# Altium footprint library PcbLib1.PcbLib: 170 footprints (part 7 of 11)
Each footprint in its own frame and in the unit in brackets; x right, y up, seen from the top. Pads: shape width x height; smd on the part's side, far side on the other; paste and mask are expansions set on the pad; w line width, h text height; cw(c..) or ccw(c..) is an arc to the next point about the centre after c.
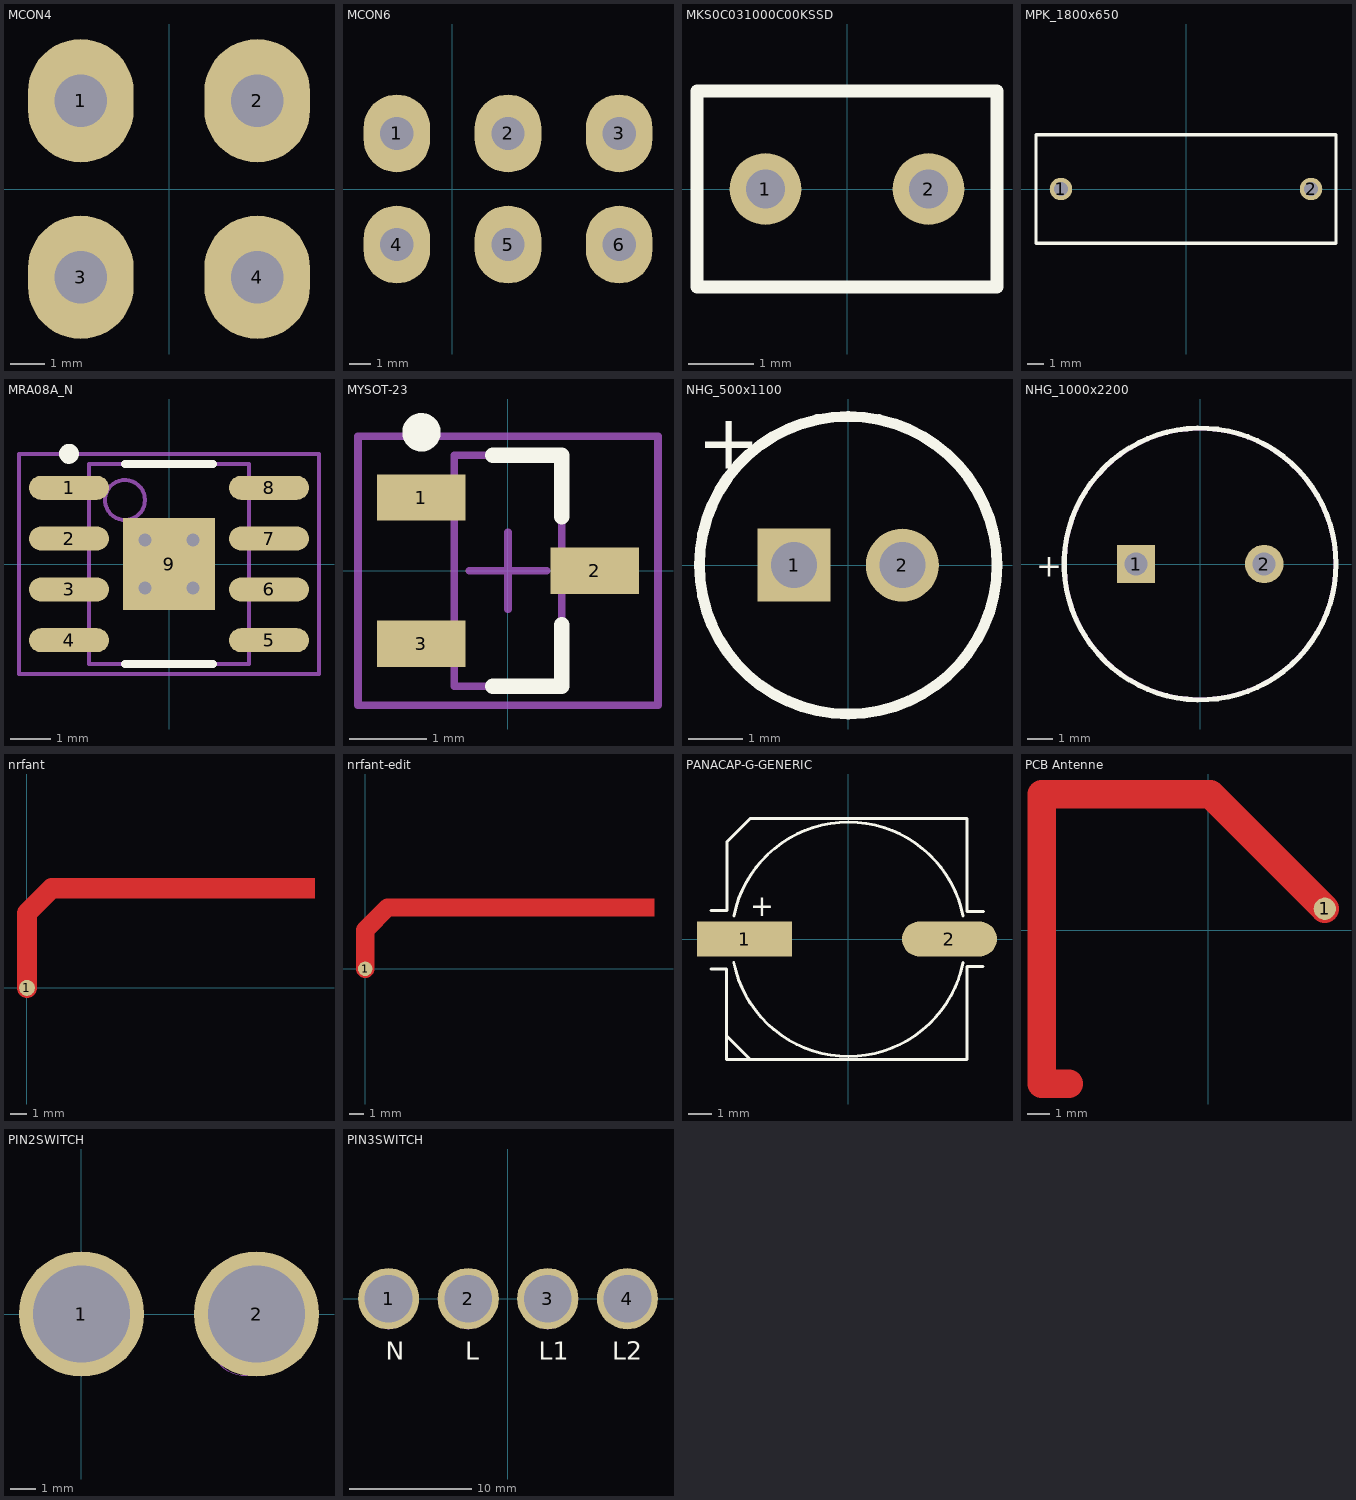
[diagram p6: the footprints below, top view; thin cyan lines are the x and y axes]

## MCON4 [mil]
pads (4):
  oval 120x140 hole 60: 1(-100,100) 2(100,100) 3(-100,-100) 4(100,-100)

## MCON6 [mil]
pads (6):
  oval 120x140 hole 60: 1(-100,100) 2(100,100) 3(300,100) 4(-100,-100) 5(100,-100) 6(300,-100)

## MKS0C031000C00KSSD [mm]
pads (2):
  round 1.1 hole 0.6: 1(-1.25,0) 2(1.25,0)
Top Overlay:
  lines w0.1: -2.3,-1.5 -2.3,1.5 2.3,1.5 2.3,-1.5 -2.3,-1.5
  lines w0.2: -2.3,-1.5 -2.3,1.5 2.3,1.5 2.3,-1.5 -2.3,-1.5
3D body: height 7.25, standoff -2.25, extent -2.3,-1.25 2.3,1.25

## MPK_1800x650 [mm] "TH, 2-Leads, Body 18x6.5mm, Lead Spacing 15mm"
height 12
pads (2):
  round 1.35 hole 0.85: 1(-7.5,0) 2(7.5,0)
Top Overlay:
  lines w0.2: -9,-3.25 9,-3.25 9,3.25 -9,3.25 -9,-3.25
Mechanical 5:
  lines w0.1: -9,-3.25 -9,3.25 9,3.25 9,-3.25 -9,-3.25
3D body: height 12, standoff 1, extent -9,-3.25 9,3.25
3D body: height 0, standoff -2.5, extent -7.797,-0.299 -7.2,0.3
3D body: height 0, standoff -2.5, extent 7.202,-0.299 7.8,0.3
3D body: height 1.9, standoff -0.1, extent -8.49,-0.996 -6.5,0.996
3D body: height 1.9, standoff -0.1, extent 6.5,-0.996 8.49,0.996

## MRA08A_N [mm] "SOIC, 8-Leads, Body 4.9x3.9mm, Pitch 1.27mm, Exposed Pad, IPC Medium Density"
height 1.68
pads (9):
  oval 2x0.6 smd: 1(-2.5,1.905) 2(-2.5,0.635) 3(-2.5,-0.635) 4(-2.5,-1.905) 5(2.5,-1.905) 6(2.5,-0.635) 7(2.5,0.635) 8(2.5,1.905)
  rect 2.29x2.29 smd: 9(0,0)
via -0.6,0.6 diameter 0.66 hole 0.33
via 0.6,0.6 diameter 0.66 hole 0.33
via 0.6,-0.6 diameter 0.66 hole 0.33
via -0.6,-0.6 diameter 0.66 hole 0.33
Top Overlay:
  circle w0.25: c-2.5,2.755 r0.125
  lines w0.2: -1.1,-2.5 1.1,-2.5 ; -1.1,2.5 1.1,2.5
Mechanical 13:
  circle w0.1: c-1.1,1.6 r0.5
  lines w0.1: -2,-2.5 -2,2.5 2,2.5 2,-2.5 -2,-2.5
Mechanical 15:
  lines w0.1: -0.5,0 0.5,0 ; 0,-0.5 0,0.5 ; -3.75,-2.75 -3.75,2.75 3.75,2.75 3.75,-2.75 -3.75,-2.75
3D body: height 1.68, standoff 0.03, extent -2,-2.5 2,2.5

## MYSOT-23 [mm] "SOT23, 3-Leads, Body 2.9x1.3mm, Pitch 0.95mm, Lead Span 2.4mm, IPC Medium Density"
height 1.14
pads (3):
  rect 1.15x0.6 smd: 1(-1.125,0.95) 2(1.125,0) 3(-1.125,-0.95)
Top Overlay:
  circle w0.25: c-1.125,1.8 r0.125
  lines w0.2: -0.2,-1.5 0.7,-1.5 0.7,-0.7 ; -0.2,1.5 0.7,1.5 0.7,0.7
Mechanical 13:
  lines w0.1: -0.7,-1.5 -0.7,1.5 0.7,1.5 0.7,-1.5 -0.7,-1.5
Mechanical 15:
  lines w0.1: -0.5,0 0.5,0 ; 0,-0.5 0,0.5 ; -1.95,-1.75 -1.95,1.75 1.95,1.75 1.95,-1.75 -1.95,-1.75
3D body: height 1.14, standoff 0, extent -0.7,-1.5 0.7,1.5

## NHG_500x1100 [mm] "TH, 2-Leads, Dia 5mm,  Lead Spacing 2mm"
height 12
pads (2):
  rect 1.35x1.35 hole 0.85: 1(-1,0)
  round 1.35 hole 0.85: 2(1,0)
Top Overlay:
  circle w0.2: c0,0 r2.75
  text "+" at -2.794,1.778 h1.02
Mechanical 5:
  circle w0.1: c0,0 r2.75
  text "+" at -3.8,-0.4 h1.02
3D body: height 12.51, standoff -3, extent -2.728,-2.745 2.75,2.746

## NHG_1000x2200 [mm] "Panasonic"
height 24
pads (2):
  rect 1.5x1.5 hole 0.9: 1(-2.5,0)
  round 1.5 hole 0.9: 2(2.5,0)
Top Overlay:
  circle w0.2: c0,0 r5.3
  text "+" at -6.4,-0.5 h0.89
Mechanical 5:
  circle w0.1: c0,0 r5.25
  text "+" at -6.4,-0.5 h0.89
3D body: height 24.01, standoff -4, extent -5.209,-5.241 5.24,5.242

## nrfant [mm]
pads (1):
  round 1 smd: 1(0,0)
Top Layer:
  region: 18.048,5.617 18.048,6.887 17.286,6.887 17.286,5.617
  lines w1.27: 0,0 0,4.689 ; 17.401,6.248 1.559,6.248 ; 0,4.689 1.559,6.248 ; 0,4.689 0,4.689 ; 1.559,6.248 1.559,6.248

## nrfant-edit [mm]
pads (1):
  round 1 smd: 1(0,0)
Top Layer:
  region: 20.048,3.617 20.048,4.887 19.286,4.887 19.286,3.617
  lines w1.27: 0,0 0,2.689 1.559,4.248 ; 1.558,4.248 19.401,4.248

## PANACAP-G-GENERIC [mil]
pads (2):
  rect 160x59.06 smd: 1(-175,0)
  oval 160x59.06 smd: 2(170,0)
Top Overlay:
  lines w5: -231.3,-50.2 -205.71,-50.2 ; -231.3,48.23 -205.71,48.23 ; -205.71,-163.39 -205.71,-50.2 ; -205.71,-104.33 -205.71,-50.2 ; -204.72,-163.39 -165.35,-202.76 ; -204.72,48.23 -204.72,163.39 -165.35,202.76 199.8,202.76 199.8,46.26 227.36,46.26 ; -193.14,-39.37 ccw(c-0.11,-0.76) 192.91,-39.37 ; -193.03,38.61 cw(c0,0) 193.03,38.61 ; 226.38,-46.26 199.8,-46.26 ; -205.71,-202.76 199.8,-202.76 199.8,-46.26 ; -205.71,-202.76 -205.71,-202.76 ; -205.71,-202.76 -205.71,-50.2 ; -205.71,-129.92 -205.71,-129.92 ; -205.71,-129.92 -205.71,-50.2 ; 199.8,-46.26 199.8,-46.26
  text "+" at -165.35,38.39 h35
3D body: height 401.57, standoff 0, extent -233.35,-202.75 223.34,202.76

## PCB Antenne [mm]
height 4
pads (1):
  round 1 smd: 1(5.225,0.971)
Top Layer:
  lines w0.762: -7.731,-6.825 -7.477,-6.851 ; 5.2,0.907 5.2,0.945
  lines w1.27: -7.477,-6.876 -6.251,-6.876 ; -7.477,-6.851 -7.477,6.103 0.092,6.103 ; 5.225,0.971 0.092,6.103 ; 0.092,6.103 0.093,6.103

## PCBComponent_1 - duplicate [mm]

## PCBComponent_1 - duplicate1 [mm]

## PIN2SWITCH [mm]
pads (2):
  round 5 hole 3.9: 1(0,0) 2(7,0)
Mechanical 1:
  lines w0.013: -1.005,-1.663 ccw(c-0.005,-0.048) 0.995,-1.663 ; -1.005,-1.663 -1.005,1.568 ; -1.005,-1.663 -0.991,-1.655 -0.977,-1.648 -0.963,-1.639 -0.948,-1.631 -0.933,-1.623 -0.918,-1.614 -0.905,-1.606 ; -1.005,1.568 cw(c-0.005,-0.048) 0.995,1.568 ; -1.005,1.568 -0.991,1.56 -0.977,1.552 -0.963,1.544 -0.948,1.536 -0.933,1.528 -0.918,1.519 -0.905,1.511 ; -0.905,-1.606 ccw(c-0.005,-0.048) 0.895,-1.606 ; -0.905,-1.606 -0.905,1.511 ; -0.905,1.511 cw(c-0.005,-0.048) 0.895,1.511 ; 0.895,-1.606 0.895,1.511 ; 0.895,-1.606 0.899,-1.609 0.914,-1.617 0.928,-1.625 0.942,-1.633 0.955,-1.641 0.969,-1.648 0.982,-1.656 0.995,-1.663 ; 0.895,1.511 0.91,1.52 0.924,1.528 0.938,1.536 0.952,1.544 0.966,1.551 0.979,1.559 0.992,1.566 0.995,1.568 ; 0.995,-1.663 0.995,1.568 ; 5.495,-1.663 ccw(c6.495,-0.048) 7.495,-1.663 ; 5.495,-1.663 5.495,1.568 ; 5.495,-1.663 5.506,-1.657 5.518,-1.651 5.529,-1.644 5.541,-1.638 5.552,-1.631 5.564,-1.624 5.576,-1.617 5.588,-1.61 5.595,-1.606 ; 5.495,1.568 cw(c6.495,-0.048) 7.495,1.568 ; 5.495,1.568 5.506,1.562 5.518,1.555 5.529,1.549 5.541,1.542 5.552,1.536 5.564,1.529 5.576,1.522 5.588,1.515 5.595,1.511 ; 5.595,-1.606 ccw(c6.495,-0.048) 7.395,-1.606 ; 5.595,-1.606 5.595,1.511 ; 5.595,1.511 cw(c6.495,-0.048) 7.395,1.511 ; 7.395,-1.606 7.395,1.511 ; 7.395,-1.606 7.402,-1.61 7.414,-1.617 7.426,-1.624 7.438,-1.631 7.45,-1.638 7.461,-1.644 7.473,-1.651 7.484,-1.657 7.495,-1.663 ; 7.395,1.511 7.408,1.518 7.42,1.525 7.432,1.532 7.444,1.539 7.455,1.546 7.467,1.552 7.478,1.559 7.49,1.565 7.495,1.568 ; 7.495,-1.663 7.495,1.568 ; -1.305,-1.148 ccw(c-0.005,-1.148) 1.295,-1.148 1.295,1.052 ccw(c-0.005,1.052) -1.305,1.052 -1.305,-1.148 ; 5.195,-1.148 ccw(c6.495,-1.148) 7.795,-1.148 7.795,1.052 ccw(c6.495,1.052) 5.195,1.052 5.195,-1.148

## PIN3SWITCH [mm]
pads (4):
  round 5 hole 3.9: 1(-9.75,0) 2(-3.25,0) 3(3.25,0) 4(9.75,0)
Top Overlay:
  text "L2" at 8.5,-5 h1.5
  text "L1" at 2.5,-5 h1.5
  text "L" at -3.5,-5 h1.5
  text "N" at -10,-5 h1.5
Mechanical 1:
  lines w0.013: -10.755,-1.663 ccw(c-9.755,-0.048) -8.755,-1.663 ; -10.755,-1.663 -10.755,1.568 ; -10.755,-1.663 -10.741,-1.655 -10.727,-1.648 -10.713,-1.639 -10.698,-1.631 -10.683,-1.623 -10.668,-1.614 -10.655,-1.606 ; -10.755,1.568 cw(c-9.755,-0.048) -8.755,1.568 ; -10.755,1.568 -10.741,1.56 -10.727,1.552 -10.713,1.544 -10.698,1.536 -10.683,1.528 -10.668,1.519 -10.655,1.511 ; -10.655,-1.606 ccw(c-9.755,-0.048) -8.855,-1.606 ; -10.655,-1.606 -10.655,1.511 ; -10.655,1.511 cw(c-9.755,-0.048) -8.855,1.511 ; -8.855,-1.606 -8.855,1.511 ; -8.855,-1.606 -8.851,-1.609 -8.836,-1.617 -8.822,-1.625 -8.808,-1.633 -8.795,-1.641 -8.781,-1.648 -8.768,-1.656 -8.755,-1.663 ; -8.855,1.511 -8.84,1.52 -8.826,1.528 -8.812,1.536 -8.798,1.544 -8.784,1.551 -8.771,1.559 -8.758,1.566 -8.755,1.568 ; -8.755,-1.663 -8.755,1.568 ; -4.255,-1.663 ccw(c-3.255,-0.048) -2.255,-1.663 ; -4.255,-1.663 -4.255,1.568 ; -4.255,-1.663 -4.244,-1.657 -4.232,-1.651 -4.221,-1.644 -4.209,-1.638 -4.198,-1.631 -4.186,-1.624 -4.174,-1.617 -4.162,-1.61 -4.155,-1.606 ; -4.255,1.568 cw(c-3.255,-0.048) -2.255,1.568 ; -4.255,1.568 -4.244,1.562 -4.232,1.555 -4.221,1.549 -4.209,1.542 -4.198,1.536 -4.186,1.529 -4.174,1.522 -4.162,1.515 -4.155,1.511 ; -4.155,-1.606 ccw(c-3.255,-0.048) -2.355,-1.606 ; -4.155,-1.606 -4.155,1.511 ; -4.155,1.511 cw(c-3.255,-0.048) -2.355,1.511 ; -2.355,-1.606 -2.355,1.511 ; -2.355,-1.606 -2.348,-1.61 -2.336,-1.617 -2.324,-1.624 -2.312,-1.631 -2.3,-1.638 -2.289,-1.644 -2.277,-1.651 -2.266,-1.657 -2.255,-1.663 ; -2.355,1.511 -2.342,1.518 -2.33,1.525 -2.318,1.532 -2.306,1.539 -2.295,1.546 -2.283,1.552 -2.272,1.559 -2.26,1.565 -2.255,1.568 ; -2.255,-1.663 -2.255,1.568 ; 2.245,-1.663 ccw(c3.245,-0.048) 4.245,-1.663 ; 2.245,-1.663 2.245,1.568 ; 2.245,-1.663 2.259,-1.655 2.273,-1.648 2.287,-1.639 2.302,-1.631 2.317,-1.623 2.332,-1.614 2.345,-1.606 ; 2.245,1.568 cw(c3.245,-0.048) 4.245,1.568 ; 2.245,1.568 2.259,1.56 2.273,1.552 2.287,1.544 2.302,1.536 2.317,1.528 2.332,1.519 2.345,1.511 ; 2.345,-1.606 ccw(c3.245,-0.048) 4.145,-1.606 ; 2.345,-1.606 2.345,1.511 ; 2.345,1.511 cw(c3.245,-0.048) 4.145,1.511 ; 4.145,-1.606 4.145,1.511 ; 4.145,-1.606 4.159,-1.614 4.174,-1.623 4.188,-1.631 4.203,-1.639 4.217,-1.648 4.231,-1.655 4.245,-1.663 ; 4.145,1.511 4.16,1.52 4.174,1.528 4.188,1.536 4.202,1.544 4.216,1.551 4.229,1.559 4.242,1.566 4.245,1.568 ; 4.245,-1.663 4.245,1.568 ; -11.055,-1.148 ccw(c-9.755,-1.148) -8.455,-1.148 -8.455,1.052 ccw(c-9.755,1.052) -11.055,1.052 -11.055,-1.148 ; -4.555,-1.148 ccw(c-3.255,-1.148) -1.955,-1.148 -1.955,1.052 ccw(c-3.255,1.052) -4.555,1.052 -4.555,-1.148 ; 1.945,-1.148 ccw(c3.245,-1.148) 4.545,-1.148 4.545,1.052 ccw(c3.245,1.052) 1.945,1.052 1.945,-1.148